# Altium footprint library ATROTECH.PcbLib: 334 footprints (part 17 of 21)
Each footprint in its own frame and in the unit in brackets; x right, y up, seen from the top. Pads: shape width x height; smd on the part's side, far side on the other; paste and mask are expansions set on the pad; w line width, h text height; cw(c..) or ccw(c..) is an arc to the next point about the centre after c.
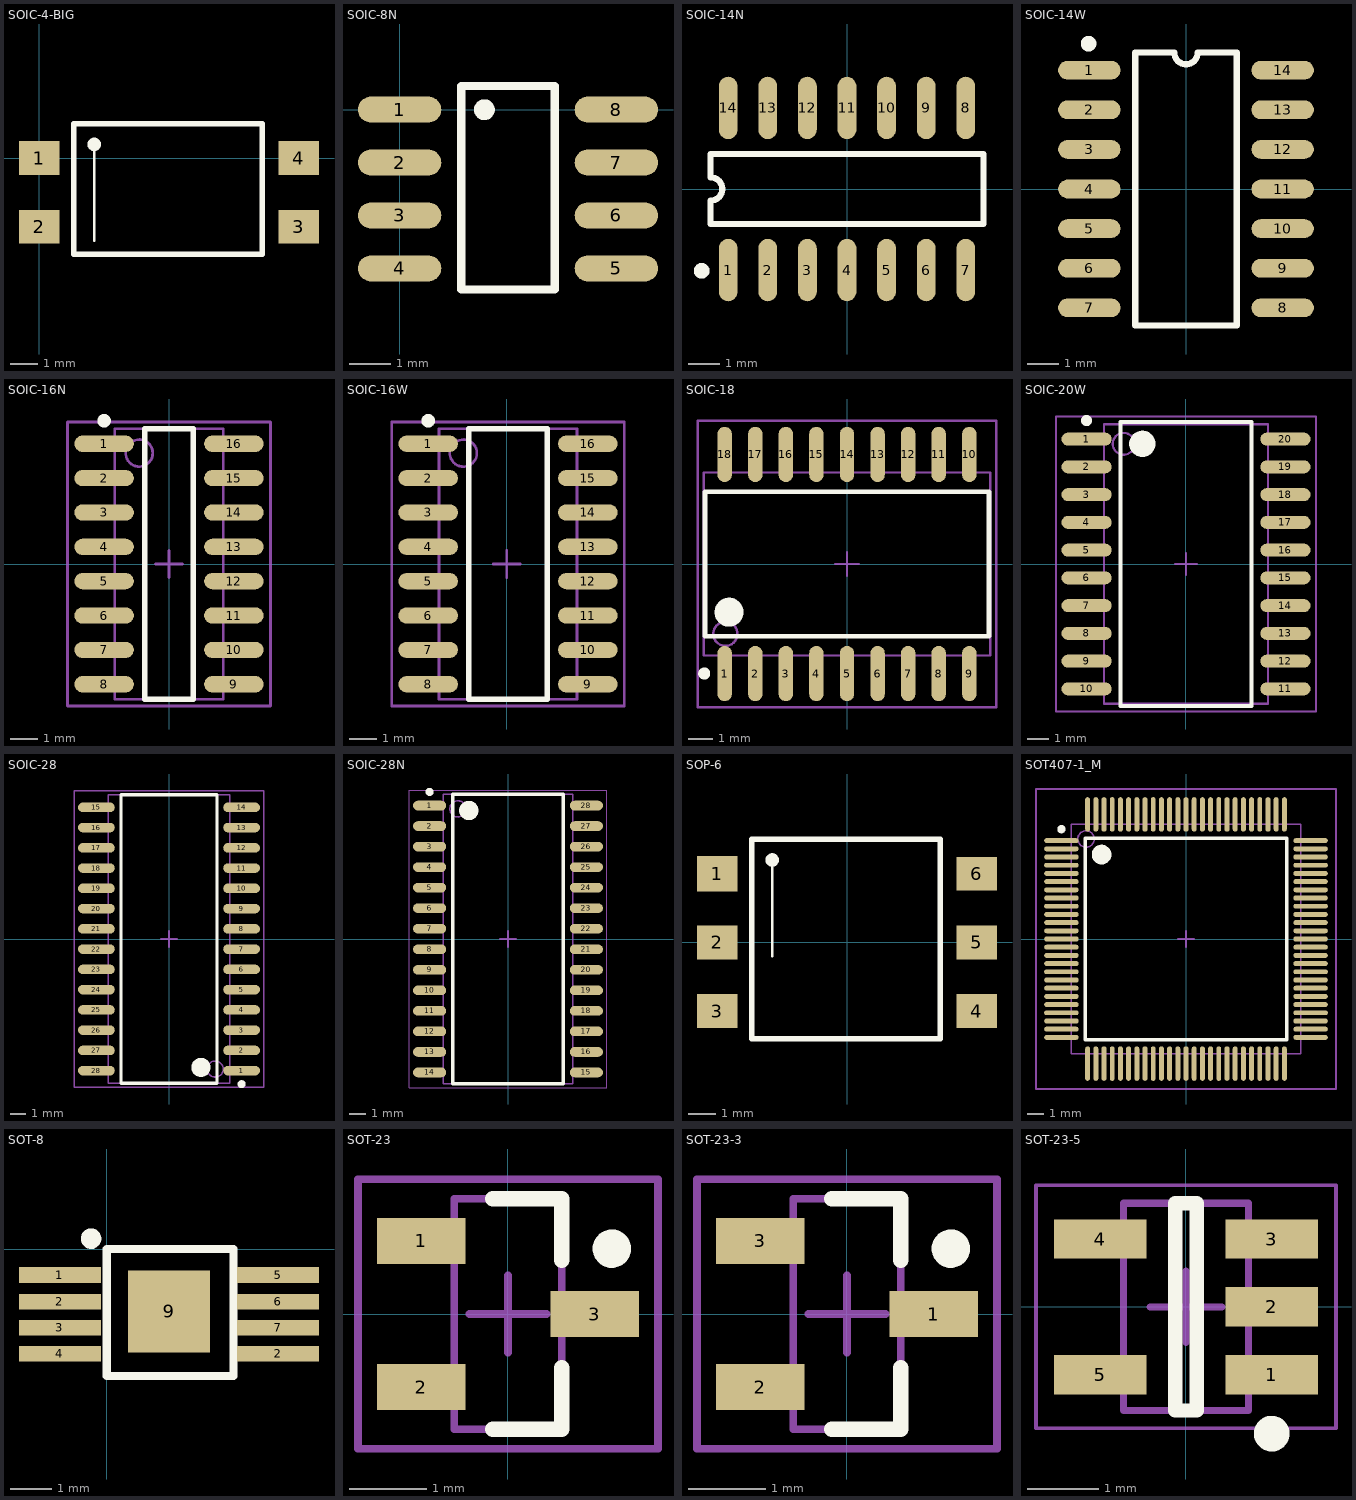
[diagram p16: the footprints below, top view; thin cyan lines are the x and y axes]

## SOIC-4-BIG [mm]
pads (4):
  rect 1.5x1.25 smd: 1(0,0) 2(0,-2.54) 3(9.6,-2.54) 4(9.6,0)
Top Overlay:
  circle w0.25: c2.032,0.508 r0.125
  lines w0.1: 2.032,-3.048 2.032,0.635
  lines w0.2: 1.27,-3.556 8.255,-3.556 8.255,1.27 1.27,1.27 1.27,-3.556
3D body "User Library-PC817_Gullwing.STEP": height 3.85, standoff 0, extent -0.174,-3.56 9.826,1.02

## SOIC-8N [mm]
pads (8):
  oval 2x0.625 smd: 1(0,0) 2(0,-1.27) 3(0,-2.54) 4(0,-3.81) 5(5.2,-3.81) 6(5.2,-2.54) 7(5.2,-1.27) 8(5.2,0)
Top Overlay:
  circle w0.25: c2.032,-0.002 r0.125
  lines w0.2: 1.475,-4.318 3.725,-4.318 3.725,0.565 1.475,0.565 1.475,-4.318
3D body "SOIC08 narrow.stp": height 2, standoff 0, extent -0.567,-4.43 5.596,0.57

## SOIC-14N [mm]
pads (14):
  oval 0.6x2 smd: 1(-3.81,-2.6) 2(-2.54,-2.6) 3(-1.27,-2.6) 4(0,-2.6) 5(1.27,-2.6) 6(2.54,-2.6) 7(3.81,-2.6) 8(3.81,2.6) 9(2.54,2.6) 10(1.27,2.6) 11(0,2.6) 12(-1.27,2.6) 13(-2.54,2.6) 14(-3.81,2.6)
Top Overlay:
  circle w0.25: c-4.66,-2.625 r0.125
  lines w0.2: -4.375,-1.125 -4.375,-0.375 ccw(c-4.375,0) -4.375,0.375 -4.375,1.125 4.375,1.125 4.375,-1.125 -4.375,-1.125
3D body "SOIC14 narrow.stp": height 2, standoff 0, extent -4.394,-3.132 4.416,3.031

## SOIC-14W [mm]
pads (14):
  oval 2x0.6 smd: 1(-3.1,3.81) 2(-3.1,2.54) 3(-3.1,1.27) 4(-3.1,0) 5(-3.1,-1.27) 6(-3.1,-2.54) 7(-3.1,-3.81) 8(3.1,-3.81) 9(3.1,-2.54) 10(3.1,-1.27) 11(3.1,0) 12(3.1,1.27) 13(3.1,2.54) 14(3.1,3.81)
Top Overlay:
  circle w0.25: c-3.125,4.66 r0.125
  lines w0.2: -1.625,-4.375 1.625,-4.375 1.625,4.375 0.375,4.375 cw(c0,4.375) -0.375,4.375 -1.625,4.375 -1.625,-4.375
3D body "User Library-SOIC-14.step": height 1.75, standoff 0, extent -3,-4.375 3,4.375

## SOIC-16N [mm]
pads (16):
  oval 2.2x0.6 smd: 1(-2.4,4.445) 2(-2.4,3.175) 3(-2.4,1.905) 4(-2.4,0.635) 5(-2.4,-0.635) 6(-2.4,-1.905) 7(-2.4,-3.175) 8(-2.4,-4.445) 9(2.4,-4.445) 10(2.4,-3.175) 11(2.4,-1.905) 12(2.4,-0.635) 13(2.4,0.635) 14(2.4,1.905) 15(2.4,3.175) 16(2.4,4.445)
Top Overlay:
  circle w0.25: c-2.4,5.295 r0.125
  lines w0.2: -0.9,-5 0.9,-5 0.9,5 -0.9,5 -0.9,-5
Mechanical 13:
  circle w0.1: c-1.1,4.1 r0.5
  lines w0.1: -2,-5 2,-5 2,5 -2,5 -2,-5
Mechanical 15:
  lines w0.1: -0.5,0 0.5,0 ; 0,-0.5 0,0.5 ; -3.75,-5.25 3.75,-5.25 3.75,5.25 -3.75,5.25 -3.75,-5.25
3D body "SOIC16 narrow.stp": height 2, standoff 0, extent -3.158,-5.025 3.005,5.055

## SOIC-16W [mm]
pads (16):
  oval 2.2x0.6 smd: 1(-2.9,4.445) 2(-2.9,3.175) 3(-2.9,1.905) 4(-2.9,0.635) 5(-2.9,-0.635) 6(-2.9,-1.905) 7(-2.9,-3.175) 8(-2.9,-4.445) 9(3,-4.445) 10(3,-3.175) 11(3,-1.905) 12(3,-0.635) 13(3,0.635) 14(3,1.905) 15(3,3.175) 16(3,4.445)
Top Overlay:
  circle w0.25: c-2.9,5.295 r0.125
  lines w0.2: -1.4,-5 -1.4,5 1.5,5 1.5,-5 -1.4,-5
Mechanical 13:
  circle w0.1: c-1.6,4.1 r0.5
  lines w0.1: -2.5,-5 -2.5,5 2.6,5 2.6,-5 -2.5,-5
Mechanical 15:
  lines w0.1: -0.5,0 0.5,0 ; 0,-0.5 0,0.5 ; -4.25,-5.25 -4.25,5.25 4.35,5.25 4.35,-5.25 -4.25,-5.25
3D body "User Library-SOIC-16L (127P690X210).step": height 2.1, standoff 0, extent -3.5,-5.2 3.5,5.2

## SOIC-18 [mm]
pads (18):
  oval 0.6x2.3 smd: 1(-5.08,-4.55) 2(-3.81,-4.55) 3(-2.54,-4.55) 4(-1.27,-4.55) 5(0,-4.55) 6(1.27,-4.55) 7(2.54,-4.55) 8(3.81,-4.55) 9(5.08,-4.55) 10(5.08,4.55) 11(3.81,4.55) 12(2.54,4.55) 13(1.27,4.55) 14(0,4.55) 15(-1.27,4.55) 16(-2.54,4.55) 17(-3.81,4.55) 18(-5.08,4.55)
Top Overlay:
  circle w0.6: c-4.9,-2 r0.3
  circle w0.25: c-5.93,-4.55 r0.125
  lines w0.2: -5.9,-3 -5.9,3 5.9,3 5.9,-3 -5.9,-3
Mechanical 13:
  circle w0.1: c-5.05,-2.9 r0.5
  lines w0.1: -5.95,-3.8 -5.95,3.8 5.95,3.8 5.95,-3.8 -5.95,-3.8
Mechanical 15:
  lines w0.1: -0.5,0 0.5,0 ; 0,-0.5 0,0.5 ; -6.2,-5.95 -6.2,5.95 6.2,5.95 6.2,-5.95 -6.2,-5.95
3D body "User Library-SOIC18-300.step": height 2.65, standoff 0, extent -5.765,-5.15 5.765,5.15

## SOIC-20W [mm]
pads (20):
  oval 2.3x0.6 smd: 1(-4.55,5.715) 2(-4.55,4.445) 3(-4.55,3.175) 4(-4.55,1.905) 5(-4.55,0.635) 6(-4.55,-0.635) 7(-4.55,-1.905) 8(-4.55,-3.175) 9(-4.55,-4.445) 10(-4.55,-5.715) 11(4.55,-5.715) 12(4.55,-4.445) 13(4.55,-3.175) 14(4.55,-1.905) 15(4.55,-0.635) 16(4.55,0.635) 17(4.55,1.905) 18(4.55,3.175) 19(4.55,4.445) 20(4.55,5.715)
Top Overlay:
  circle w0.25: c-4.55,6.565 r0.125
  circle w0.6: c-2,5.5 r0.3
  lines w0.2: -3,-6.5 -3,6.5 3,6.5 3,-6.5 -3,-6.5
Mechanical 13:
  circle w0.1: c-2.85,5.5 r0.5
  lines w0.1: -3.75,-6.4 -3.75,6.4 3.75,6.4 3.75,-6.4 -3.75,-6.4
Mechanical 15:
  lines w0.1: -0.5,0 0.5,0 ; 0,-0.5 0,0.5 ; -5.95,-6.75 -5.95,6.75 5.95,6.75 5.95,-6.75 -5.95,-6.75
3D body "SO20_WIDE.step": height 1.7, standoff 0, extent -5.321,-6.223 5.321,6.223

## SOIC-28 [mm]
pads (28):
  oval 2.3x0.6 smd: 1(4.55,-8.255) 2(4.55,-6.985) 3(4.55,-5.715) 4(4.55,-4.445) 5(4.55,-3.175) 6(4.55,-1.905) 7(4.55,-0.635) 8(4.55,0.635) 9(4.55,1.905) 10(4.55,3.175) 11(4.55,4.445) 12(4.55,5.715) 13(4.55,6.985) 14(4.55,8.255) 15(-4.55,8.255) 16(-4.55,6.985) 17(-4.55,5.715) 18(-4.55,4.445) 19(-4.55,3.175) 20(-4.55,1.905) 21(-4.55,0.635) 22(-4.55,-0.635) 23(-4.55,-1.905) 24(-4.55,-3.175) 25(-4.55,-4.445) 26(-4.55,-5.715) 27(-4.55,-6.985) 28(-4.55,-8.255)
Top Overlay:
  circle w0.25: c4.55,-9.105 r0.125
  circle w0.6: c2,-8.05 r0.3
  lines w0.2: -3,-9.05 -3,9.05 3,9.05 3,-9.05 -3,-9.05
Mechanical 13:
  circle w0.1: c2.9,-8.155 r0.5
  lines w0.1: -3.8,-9.055 -3.8,9.055 3.8,9.055 3.8,-9.055 -3.8,-9.055
Mechanical 15:
  lines w0.1: -0.5,0 0.5,0 ; 0,-0.5 0,0.5 ; -5.95,-9.3 -5.95,9.3 5.95,9.3 5.95,-9.3 -5.95,-9.3
3D body "User Library-28-SOIC.step": height 2.83, standoff 0.07, extent -5.15,-9.017 5.15,8.883

## SOIC-28N [mm]
pads (28):
  oval 2.05x0.6 smd: 1(-4.85,8.255) 2(-4.85,6.985) 3(-4.85,5.715) 4(-4.85,4.445) 5(-4.85,3.175) 6(-4.85,1.905) 7(-4.85,0.635) 8(-4.85,-0.635) 9(-4.85,-1.905) 10(-4.85,-3.175) 11(-4.85,-4.445) 12(-4.85,-5.715) 13(-4.85,-6.985) 14(-4.85,-8.255) 15(4.85,-8.255) 16(4.85,-6.985) 17(4.85,-5.715) 18(4.85,-4.445) 19(4.85,-3.175) 20(4.85,-1.905) 21(4.85,-0.635) 22(4.85,0.635) 23(4.85,1.905) 24(4.85,3.175) 25(4.85,4.445) 26(4.85,5.715) 27(4.85,6.985) 28(4.85,8.255)
Top Overlay:
  circle w0.25: c-4.85,9.105 r0.125
  circle w0.6: c-2.425,7.95 r0.3
  lines w0.2: -3.425,-8.95 -3.425,8.95 3.425,8.95 3.425,-8.95 -3.425,-8.95
Mechanical 13:
  circle w0.1: c-3.1,8.05 r0.5
  lines w0.1: -4,-8.95 -4,8.95 4,8.95 4,-8.95 -4,-8.95
Mechanical 15:
  lines w0.05: -6.1,-9.2 -6.1,9.2 6.1,9.2 6.1,-9.2 -6.1,-9.2
  lines w0.1: -0.5,0 0.5,0 ; 0,-0.5 0,0.5
3D body "SOIC28 wide.stp": height 2, standoff 0, extent -5.081,-9.04 5.082,9.04

## SOP-6 [mm]
pads (6):
  rect 1.5x1.3 smd: 1(-4.8,2.54)
  rect 1.5x1.25 smd: 2(-4.8,0) 3(-4.8,-2.54) 4(4.8,-2.54) 5(4.8,0) 6(4.8,2.54)
Top Overlay:
  circle w0.25: c-2.768,3.048 r0.125
  lines w0.1: -2.768,-0.508 -2.768,3.175
  lines w0.2: -3.53,-3.56 -3.53,3.81 3.455,3.81 3.455,-3.56 -3.53,-3.56
3D body "User Library-PC817_Gullwing.STEP": height 3.85, standoff 0, extent -4.974,-1.02 5.026,3.56
3D body "User Library-PC817_Gullwing.STEP": height 3.85, standoff 0, extent -4.974,-3.56 5.026,1.02

## SOT407-1_M [mm] "Thin QFP, 100-Leads, Body 14x14mm, Pitch 0.5mm, IPC Low Density"
height 1.6
pads (100):
  oval 2.1x0.3 smd: 1(-7.6,6) 2(-7.6,5.5) 3(-7.6,5) 4(-7.6,4.5) 5(-7.6,4) 6(-7.6,3.5) 7(-7.6,3) 8(-7.6,2.5) 9(-7.6,2) 10(-7.6,1.5) 11(-7.6,1) 12(-7.6,0.5) 13(-7.6,0) 14(-7.6,-0.5) 15(-7.6,-1) 16(-7.6,-1.5) 17(-7.6,-2) 18(-7.6,-2.5) 19(-7.6,-3) 20(-7.6,-3.5) 21(-7.6,-4) 22(-7.6,-4.5) 23(-7.6,-5) 24(-7.6,-5.5) 25(-7.6,-6) 51(7.6,-6) 52(7.6,-5.5) 53(7.6,-5) 54(7.6,-4.5) 55(7.6,-4) 56(7.6,-3.5) 57(7.6,-3) 58(7.6,-2.5) 59(7.6,-2) 60(7.6,-1.5) 61(7.6,-1) 62(7.6,-0.5) 63(7.6,0) 64(7.6,0.5) 65(7.6,1) 66(7.6,1.5) 67(7.6,2) 68(7.6,2.5) 69(7.6,3) 70(7.6,3.5) 71(7.6,4) 72(7.6,4.5) 73(7.6,5) 74(7.6,5.5) 75(7.6,6)
  oval 0.3x2.1 smd: 26(-6,-7.6) 27(-5.5,-7.6) 28(-5,-7.6) 29(-4.5,-7.6) 30(-4,-7.6) 31(-3.5,-7.6) 32(-3,-7.6) 33(-2.5,-7.6) 34(-2,-7.6) 35(-1.5,-7.6) 36(-1,-7.6) 37(-0.5,-7.6) 38(0,-7.6) 39(0.5,-7.6) 40(1,-7.6) 41(1.5,-7.6) 42(2,-7.6) 43(2.5,-7.6) 44(3,-7.6) 45(3.5,-7.6) 46(4,-7.6) 47(4.5,-7.6) 48(5,-7.6) 49(5.5,-7.6) 50(6,-7.6) 76(6,7.6) 77(5.5,7.6) 78(5,7.6) 79(4.5,7.6) 80(4,7.6) 81(3.5,7.6) 82(3,7.6) 83(2.5,7.6) 84(2,7.6) 85(1.5,7.6) 86(1,7.6) 87(0.5,7.6) 88(0,7.6) 89(-0.5,7.6) 90(-1,7.6) 91(-1.5,7.6) 92(-2,7.6) 93(-2.5,7.6) 94(-3,7.6) 95(-3.5,7.6) 96(-4,7.6) 97(-4.5,7.6) 98(-5,7.6) 99(-5.5,7.6) 100(-6,7.6)
Top Overlay:
  circle w0.6: c-5.15,5.15 r0.3
  circle w0.25: c-7.6,6.7 r0.125
  lines w0.2: -6.15,-6.15 6.15,-6.15 6.15,6.15 -6.15,6.15 -6.15,-6.15
Mechanical 13:
  circle w0.1: c-6.1,6.1 r0.5
  lines w0.1: -7,-7 7,-7 7,7 -7,7 -7,-7
Mechanical 15:
  lines w0.1: -0.5,0 0.5,0 ; 0,-0.5 0,0.5 ; -9.15,-9.15 9.15,-9.15 9.15,9.15 -9.15,9.15 -9.15,-9.15
3D body: height 1.6, standoff 0, extent -7,-7 7,7

## SOT-8 [mm]
pads (9):
  rect 2x0.38 smd: 1(-1.143,-0.635) 2(-1.143,-1.285) 2(4.191,-2.555) 3(-1.143,-1.92) 4(-1.143,-2.555) 5(4.191,-0.635) 6(4.191,-1.285) 7(4.191,-1.92)
  rect 2x2 smd: 9(1.524,-1.524)
Top Overlay:
  circle w0.25: c-0.381,0.254 r0.125
  lines w0.2: 0,-3.1 0,0 3.1,0 3.1,-3.1 0,-3.1

## SOT-23 [mm]
pads (3):
  rect 1.15x0.6 smd: 1(-1.125,0.95) 2(-1.125,-0.95) 3(1.125,0)
Top Overlay:
  circle w0.25: c1.35,0.85 r0.125
  lines w0.2: -0.2,-1.5 0.7,-1.5 0.7,-0.7 ; -0.2,1.5 0.7,1.5 0.7,0.7
Mechanical 13:
  lines w0.1: -0.7,-1.5 0.7,-1.5 0.7,1.5 -0.7,1.5 -0.7,-1.5
Mechanical 15:
  lines w0.1: -0.5,0 0.5,0 ; 0,-0.5 0,0.5 ; -1.95,-1.75 1.95,-1.75 1.95,1.75 -1.95,1.75 -1.95,-1.75
3D body "SOT23.STEP": height 1.2, standoff -0.02, extent -1.126,-1.5 1.126,1.5

## SOT-23-3 [mm] "SOT-23 3PIN"
pads (3):
  rect 1.15x0.6 smd: 1(1.125,0) 2(-1.125,-0.95) 3(-1.125,0.95)
Top Overlay:
  circle w0.25: c1.35,0.85 r0.125
  lines w0.2: -0.2,-1.5 0.7,-1.5 0.7,-0.7 ; -0.2,1.5 0.7,1.5 0.7,0.7
Mechanical 13:
  lines w0.1: -0.7,-1.5 0.7,-1.5 0.7,1.5 -0.7,1.5 -0.7,-1.5
Mechanical 15:
  lines w0.1: -0.5,0 0.5,0 ; 0,-0.5 0,0.5 ; -1.95,-1.75 1.95,-1.75 1.95,1.75 -1.95,1.75 -1.95,-1.75
3D body "SOT23.STEP": height 1.2, standoff -0.02, extent -1.126,-1.5 1.126,1.5

## SOT-23-5 [mm]
pads (5):
  rect 1.3x0.55 smd: 1(1.2,-0.95) 2(1.2,0) 3(1.2,0.95) 4(-1.2,0.95) 5(-1.2,-0.95)
Top Overlay:
  circle w0.25: c1.2,-1.775 r0.125
  lines w0.2: -0.15,-1.45 0.15,-1.45 0.15,1.45 -0.15,1.45 -0.15,-1.45
Mechanical 13:
  lines w0.1: -0.875,-1.45 -0.875,1.45 0.875,1.45 0.875,-1.45 -0.875,-1.45
Mechanical 15:
  lines w0.05: -2.1,-1.7 -2.1,1.7 2.1,1.7 2.1,-1.7 -2.1,-1.7
  lines w0.1: -0.5,0 0.5,0 ; 0,-0.5 0,0.5
3D body "SOT23_5.stp": height 0.92, standoff 0.01, extent -1.602,-1.476 1.602,1.524